# Altium footprint library PCB_Footprints.PcbLib: 303 footprints (part 3 of 19)
Each footprint in its own frame and in the unit in brackets; x right, y up, seen from the top. Pads: shape width x height; smd on the part's side, far side on the other; paste and mask are expansions set on the pad; w line width, h text height; cw(c..) or ccw(c..) is an arc to the next point about the centre after c.
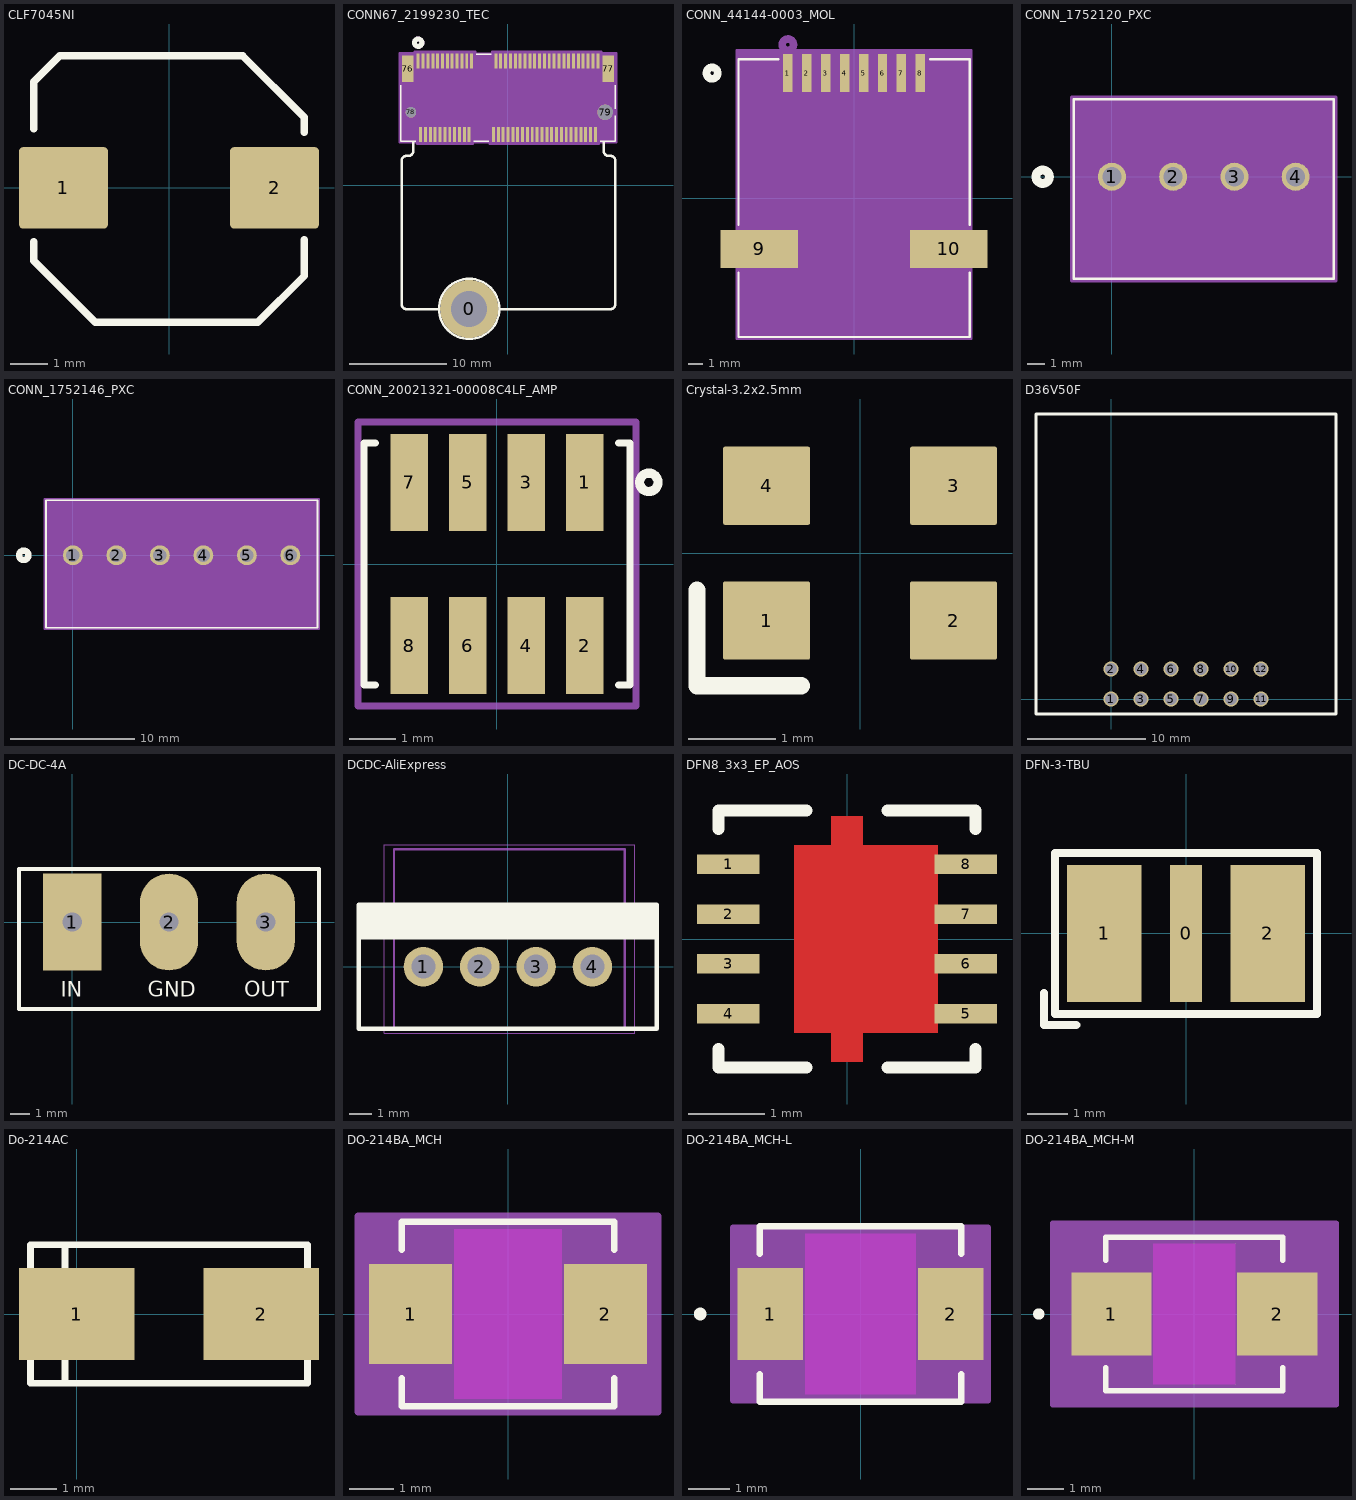
[diagram p2: the footprints below, top view; thin cyan lines are the x and y axes]

## CLF7045NI [mm] "From TDK CLF7045NIT-470M-D  Datasheet"
height 4.5
pads (2):
  rrect10% 2.4x2.2 smd: 1(-2.85,0) 2(2.85,0)
Top Overlay:
  lines w0.2: -3.65,-1.45 -3.65,-1.966 -1.986,-3.63 2.4,-3.63 3.65,-2.38 3.65,-1.4 ; -3.65,1.6 -3.65,2.87 -2.95,3.57 1.986,3.57 3.65,1.906 3.65,1.5
3D body "clf7045ni-d.step": height 4.79, standoff -0.01, extent -3.8,-3.63 3.8,3.57

## CONN67_2199230_TEC [mil]
pads (72):
  round 236.22 hole 145.67: 0(-157.48,-502.46)
  rect 12x61 smd paste+0 mask+3.94: 1(-364.17,502.46) 2(-354.33,205.22) 3(-344.49,502.46) 4(-334.65,205.22) 5(-324.8,502.46) 6(-314.96,205.22) 7(-305.12,502.46) 8(-295.28,205.22) 9(-285.43,502.46) 10(-275.59,205.22) 11(-265.75,502.46) 12(-255.91,205.22) 13(-246.06,502.46) 14(-236.22,205.22) 15(-226.38,502.46) 16(-216.54,205.22) 17(-206.69,502.46) 18(-196.85,205.22) 19(-187.01,502.46) 20(-177.17,205.22) 21(-167.32,502.46) 22(-157.48,205.22) 23(-147.64,502.46) 32(-59.06,205.22) 33(-49.21,502.46) 34(-39.37,205.22) 35(-29.53,502.46) 36(-19.68,205.22) 37(-9.84,502.46) 38(0,205.22) 39(9.84,502.46) 40(19.69,205.22) 41(29.53,502.46) 42(39.37,205.22) 43(49.21,502.46) 44(59.06,205.22) 45(68.9,502.46) 46(78.74,205.22) 47(88.58,502.46) 48(98.43,205.22) 49(108.27,502.46) 50(118.11,205.22) 51(127.95,502.46) 52(137.8,205.22) 53(147.64,502.46) 54(157.48,205.22) 55(167.32,502.46) 56(177.17,205.22) 57(187.01,502.46) 58(196.85,205.22) 59(206.69,502.46) 60(216.54,205.22) 61(226.38,502.46) 62(236.22,205.22) 63(246.06,502.46) 64(255.91,205.22) 65(265.75,502.46) 66(275.59,205.22) 67(285.43,502.46) 68(295.28,205.22) 69(305.12,502.46) 70(314.96,205.22) 71(324.8,502.46) 72(334.65,205.22) 73(344.49,502.46) 74(354.33,205.22) 75(364.17,502.46)
  rect 47x108 smd paste-54 mask+3.94: 76(-407.48,471.95) 77(407.48,471.95)
  round 43 / inner round 60 / far side round 43 hole 43 unplated paste-21.5 mask-21.5: 78(-393.7,294.78)
  round 63 / inner round 60 / far side round 63 hole 63 unplated paste-31.5 mask-31.5: 79(393.7,294.78)
Top Overlay:
  circle w20: c-364.17,577.46 r15
  circle w10: c-157.48,-502.46 r122.05
  lines w6: -436,405.85 -436,177.34 -373.43,177.34 ; -138.38,177.34 -78.16,177.34 ; -128.54,530.34 -68.31,530.34 ; 373.43,177.34 436,177.34 436,280.64 ; 436,308.92 436,405.85
  lines w10: -383.86,172.34 -383.86,173.72 -383.86,138.29 cw(c-403.54,138.29) -403.54,118.6 -411.42,118.6 ccw(c-411.42,98.92) -431.1,98.92 -431.1,-483.76 ccw(c-411.42,-483.76) -411.42,-503.44 -281.5,-503.44 ; -34.45,-503.44 415.35,-503.44 ccw(c415.35,-483.76) 435.04,-483.76 435.04,98.92 ccw(c415.35,98.92) 415.35,118.6 407.48,118.6 cw(c407.48,138.29) 387.8,138.29 387.8,173.72
Bottom Overlay:
  circle w20: c-364.17,577.46 r15
Mechanical 13:
  circle w20: c-364.17,577.46 r15
  lines w1: -431,182.34 431,182.34 431,525.34 -431,525.34 -431,182.34
Mechanical 15:
  region: 440.98,407.95 440.98,535.95 380.17,535.95 380.17,542.96 -65.21,542.96 -65.21,535.34 -131.64,535.34 -131.64,542.96 -380.17,542.96 -380.17,535.95 -440.98,535.95 -440.98,407.95 -441,407.95 -441,172.34 -370.33,172.34 -370.33,164.72 -141.48,164.72 -141.48,172.34 -75.06,172.34 -75.06,164.72 370.33,164.72 370.33,172.34 441,172.34 441,407.95
  lines w6: -440.98,407.95 -440.98,535.95 -380.17,535.95 -380.17,542.96 -131.64,542.96 -131.64,535.34 -65.21,535.34 -65.21,542.96 380.17,542.96 380.17,535.95 440.98,535.95 440.98,407.95 ; -441,407.95 -440.98,407.95 ; -441,407.95 -441,172.34 -370.33,172.34 -370.33,164.72 -141.48,164.72 -141.48,172.34 -75.06,172.34 -75.06,164.72 370.33,164.72 370.33,172.34 441,172.34 441,407.95 ; 440.98,407.95 441,407.95
3D body "2199230-4-M._2.STEP": height 165.35, standoff -25.59, extent -431.1,183.56 431.1,526.08
3D body "MicroMod-Teensy.STEP": height 180.71, standoff 31.19, extent -431.1,-503.44 435.04,362.7

## CONN_44144-0003_MOL [mil]
pads (10):
  rect 25x100 smd paste+0 mask+0: 1(-175,330.11) 2(-125,330.11) 3(-75,330.11) 4(-25,330.11) 5(25,330.11) 6(75,330.11) 7(125,330.11) 8(175,330.11)
  rect 205x100 smd paste-102.5 mask-102.5: 9(-250,-134.26) 10(250,-134.26)
Top Overlay:
  circle w20: c-375,330.11 r15
  lines w6: -305,-197.36 -305,-367 305,-367 305,-197.36 ; -305,-71.16 -305,367 -200.6,367 ; 200.6,367 305,367 305,-71.16
Bottom Overlay:
  circle w20: c-375,330.11 r15
Mechanical 13:
  circle w20: c-175,405.11 r15
  lines w1: -300,-362 300,-362 300,362 -300,362 -300,-362
Mechanical 15:
  region: 310,390.11 -310,390.11 -310,-372 310,-372
  lines w6: -310,-372 -310,390.11 310,390.11 310,-372 -310,-372

## CONN_1752120_PXC [mil]
pads (4):
  round 63 / inner round 60 / far side round 63 hole 43 paste-31.5 mask+0: 1(0,0) 2(137.8,0) 3(275.59,0) 4(413.39,0)
Top Overlay:
  circle w20: c-155.71,0 r15
  lines w6: -85.71,-229.41 499.09,-229.41 499.09,174.29 -85.71,174.29 -85.71,-229.41
Bottom Overlay:
  circle w20: c-155.71,0 r15
Mechanical 13:
  circle w20: c0,75 r15
  lines w1: -80.71,-224.41 494.09,-224.41 494.09,169.29 -80.71,169.29 -80.71,-224.41
Mechanical 15:
  region: 504.09,179.29 -90.71,179.29 -90.71,-234.41 504.09,-234.41
  lines w6: -90.71,-234.41 -90.71,179.29 504.09,179.29 504.09,-234.41 -90.71,-234.41
3D body "1752120.stp": height 488.19, standoff -137.78, extent -82.68,-220.47 492.13,173.23

## CONN_1752146_PXC [mil]
pads (6):
  round 63 / inner round 60 / far side round 63 hole 43 paste-31.5 mask+0: 1(0,0) 2(137.8,0) 3(275.59,0) 4(413.39,0) 5(551.18,0) 6(688.98,0)
Top Overlay:
  circle w20: c-155.71,0 r15
  lines w6: -85.71,-229.41 774.69,-229.41 774.69,174.29 -85.71,174.29 -85.71,-229.41
Bottom Overlay:
  circle w20: c-155.71,0 r15
Mechanical 13:
  circle w20: c0,75 r15
  lines w1: -80.71,-224.41 769.69,-224.41 769.69,169.29 -80.71,169.29 -80.71,-224.41
Mechanical 15:
  region: 779.69,179.29 -90.71,179.29 -90.71,-234.41 779.69,-234.41
  lines w6: -90.71,-234.41 -90.71,179.29 779.69,179.29 779.69,-234.41 -90.71,-234.41
3D body "1752146.stp": height 488.19, standoff -137.78, extent -86.61,-220.47 763.78,173.23

## CONN_20021321-00008C4LF_AMP [mil]
pads (8):
  rect 32x83 smd paste+0 mask+0: 1(75,69.96) 2(75,-69.81) 3(25,69.96) 4(25,-69.81) 5(-25,69.96) 6(-25,-69.81) 7(-75,69.96) 8(-75,-69.81)
Top Overlay:
  circle w7.87: c130,70 r7.87
  lines w6: -104.1,-103.5 -114,-103.5 -114,103.5 -104.1,103.5 ; 104.1,-103.5 114,-103.5 114,103.5 104.1,103.5
Mechanical 15:
  lines w6: -119,-121.31 -119,121.46 119,121.46 119,-121.31 -119,-121.31
3D body "20021321-1008xxlfc.stp": height 177.17, standoff 0, extent -108.11,-87.17 110,90

## Crystal-3.2x2.5mm [mm] "Crystal 3.2x2.5mm, from ECS model 403 datasheet"
height 0.8
pads (4):
  rrect5% 1x0.9 smd: 1(-1.075,-0.775) 2(1.075,-0.775) 3(1.075,0.775) 4(-1.075,0.775)
Top Overlay:
  lines w0.2: -1.875,-0.425 -1.875,-1.525 -0.675,-1.525
3D body: height 0.8, standoff 0.1, extent -1.6,-1.25 1.6,1.25

## D36V50F [mm]
pads (12):
  round 1.27 hole 1.02: 1(0,0) 2(0,2.54) 3(2.54,0) 4(2.54,2.54) 5(5.08,0) 6(5.08,2.54) 7(7.62,0) 8(7.62,2.54) 9(10.16,0) 10(10.16,2.54) 11(12.7,0) 12(12.7,2.54)
Top Overlay:
  lines w0.254: -6.35,-1.27 19.05,-1.27 19.05,24.13 -6.35,24.13 -6.35,-1.27

## DC-DC-4A [mm] "Connector; Header; 2 Position"
pads (3):
  rect 3x5 hole 1: 1(0,0)
  oval 3x5 hole 1: 2(5,0) 3(10,0)
Top Overlay:
  lines w0.2: -2.75,-4.5 12.75,-4.5 12.75,2.75 -2.75,2.75 -2.75,-4.5
  text "OUT" at 8.9,-3.85 h0.8
  text "GND" at 3.9,-3.85 h0.8
  text "IN" at -0.6,-3.85 h0.8
3D body "DC-DC-4A.step": height 17.21, standoff -0.04, extent -2.75,-4.553 12.75,2.75

## DCDC-AliExpress [mm] "Non-Isolated Switching Regulator DC-DC TO-220"
height 16.5
pads (4):
  round 1.78 hole 1.08: 1(-3.81,0) 2(-1.27,0) 3(1.27,0) 4(3.81,0)
Top Overlay:
  region: -6.707,2.8 6.72,2.8 6.77,2.75 6.77,1.25 -6.757,1.25
  lines w0.2: -6.73,-2.8 6.72,-2.8 6.72,2.8 -6.73,2.8 -6.73,-2.8
Mechanical 13:
  lines w0.1: -5.13,-2.8 -5.13,5.3 5.27,5.3 5.27,-2.8 -5.13,-2.8
Mechanical 15:
  lines w0.05: -5.58,-3 5.72,-3 5.72,5.5 -5.58,5.5 -5.58,-3
  lines w0.1: 0.82,0 1.72,0 ; 1.27,-0.45 1.27,0.45
3D body "User Library-OKI-78SR_Vert.STEP": height 16.6, standoff -3.2, extent -5.13,-2.823 5.27,5.25

## DFN8_3x3_EP_AOS [mil]
pads (8):
  rect 32x10 smd paste+0 mask+0: 1(-61,38.39) 2(-61,12.8) 3(-61,-12.8) 4(-61,-38.39) 5(61,-38.39) 6(61,-12.8) 7(61,12.8) 8(61,38.39)
Top Layer:
  region: -27,-48 -27,48 46.53,48 46.53,-48
  region: 0,-46.52 8,-46.52 8,-63 0,-63
  region: 0,-46.37 -8,-46.37 -8,-63 0,-63
  region: 0,47 -8,47 -8,63 0,63
  region: 0,46.89 8,46.89 8,63 0,63
Top Overlay:
  lines w6: -66,-56.49 -66,-66 -20.75,-66 ; -66,56.49 -66,66 -20.75,66 ; 20.75,-66 66,-66 66,-56.49 ; 20.75,66 66,66 66,56.49
Top Paste:
  region: -27,-48 -27,48 45,48 45,-48
  region: 0,-48 8,-48 8,-63 0,-63
  region: 0,-48 -8,-48 -8,-63 0,-63
  region: 0,48 8,48 8,63 0,63
  region: 0,48 -8,48 -8,63 0,63
Top Solder:
  region: 0,-48 8,-48 8,-63 0,-63
  region: 0,-48 -8,-48 -8,-63 0,-63
  region: 0,48 8,48 8,63 0,63
  region: 0,48 -8,48 -8,63 0,63
  region: -27,-48 -27,48 45,48 45,-48
3D body: height 29.53, standoff 0, extent -62.2,-62.2 62.2,62.2
3D body: height 10, standoff 0, extent 0,0 10,10

## DFN-3-TBU [mm] "Dual Flat No lead package for Bourns TBU-CA components"
height 0.8
pads (3):
  rrect0% 0.8x3.4 smd: 0(0,0)
  rrect0% 1.85x3.4 smd: 1(-2.025,0) 2(2.025,0)
Top Overlay:
  lines w0.2: -3.525,-1.475 -3.525,-2.275 -2.725,-2.275 ; -3.25,-2 3.25,-2 3.25,2 -3.25,2 -3.25,-2
3D body "User Library-Part+Studio+1.STEP": height 1, standoff -0.05, extent -3.25,-2 3.25,2

## Do-214AC [mm]
pads (2):
  rect 2.5x2 smd: 1(0,0) 2(4,0)
Top Overlay:
  lines w0.15: -0.25,-1.5 -0.25,1.5 ; -1,-1.5 -1,1.5 5,1.5 5,-1.5 -1,-1.5

## DO-214BA_MCH [mil]
pads (2):
  rect 74x89 smd paste+0 mask+0: 1(-87,0) 2(87,0)
Top Layer keep-out:
  region: -48,-75.5 -48,75.5 48,75.5 48,-75.5
Top Overlay:
  lines w6: -95,-57.6 -95,-82.5 95,-82.5 95,-57.6 ; -95,57.6 -95,82.5 95,82.5 95,57.6
Keep-Out Layer:
  region: -48,-75.5 -48,75.5 48,75.5 48,-75.5
Mechanical 13:
  lines w1: -90,-38.75 -51.25,-77.5 ; -90,38.75 -51.25,77.5 ; -110,-43.5 -110,43.5 -90,43.5 -90,-43.5 -110,-43.5 ; -90,-77.5 90,-77.5 90,77.5 -90,77.5 -90,-77.5 ; 90,-43.5 90,43.5 110,43.5 110,-43.5 90,-43.5
Mechanical 15:
  region: 134,-87.5 -134,-87.5 -134,87.5 134,87.5
  lines w6: -134,-87.5 -134,87.5 134,87.5 134,-87.5 -134,-87.5

## DO-214BA_MCH-L [mil]
pads (2):
  rect 62x87 smd paste+0 mask+0: 1(-85,0) 2(85,0)
Top Layer keep-out:
  region: -52,-75.5 -52,75.5 52,75.5 52,-75.5
Top Overlay:
  circle w6: c-151,0 r3
  lines w6: -95,-56.6 -95,-82.5 95,-82.5 95,-56.6 ; -95,56.6 -95,82.5 95,82.5 95,56.6
Keep-Out Layer:
  region: -52,-75.5 -52,75.5 52,75.5 52,-75.5
Mechanical 13:
  circle w0: c-85,0 r3
  lines w1: -90,-38.75 -51.25,-77.5 ; -90,38.75 -51.25,77.5 ; -110,-43.5 -110,43.5 -90,43.5 -90,-43.5 -110,-43.5 ; -90,-77.5 90,-77.5 90,77.5 -90,77.5 -90,-77.5 ; 90,-43.5 90,43.5 110,43.5 110,-43.5 90,-43.5
Mechanical 15:
  region: 120,-81.5 -120,-81.5 -120,81.5 120,81.5
  lines w6: -120,-81.5 -120,81.5 120,81.5 120,-81.5 -120,-81.5

## DO-214BA_MCH-M [mil]
pads (2):
  rect 86x89 smd paste+0 mask+0: 1(-89,0) 2(89,0)
Top Layer keep-out:
  region: -44,-75.5 -44,75.5 44,75.5 44,-75.5
Top Overlay:
  circle w6: c-167,0 r3
  lines w6: -95,-57.6 -95,-82.5 95,-82.5 95,-57.6 ; -95,57.6 -95,82.5 95,82.5 95,57.6
Keep-Out Layer:
  region: -44,-75.5 -44,75.5 44,75.5 44,-75.5
Mechanical 13:
  circle w0: c-89,0 r3
  lines w1: -90,-38.75 -51.25,-77.5 ; -90,38.75 -51.25,77.5 ; -110,-43.5 -90,-43.5 -90,43.5 -110,43.5 -110,-43.5 ; -90,-77.5 -90,77.5 90,77.5 90,-77.5 -90,-77.5 ; 90,-43.5 110,-43.5 110,43.5 90,43.5 90,-43.5
Mechanical 15:
  region: 152,-97.5 -152,-97.5 -152,97.5 152,97.5
  lines w6: -152,-97.5 152,-97.5 152,97.5 -152,97.5 -152,-97.5